# Altium footprint library DBLib.PcbLib: 99 footprints (part 3 of 7)
Each footprint in its own frame and in the unit in brackets; x right, y up, seen from the top. Pads: shape width x height; smd on the part's side, far side on the other; paste and mask are expansions set on the pad; w line width, h text height; cw(c..) or ccw(c..) is an arc to the next point about the centre after c.
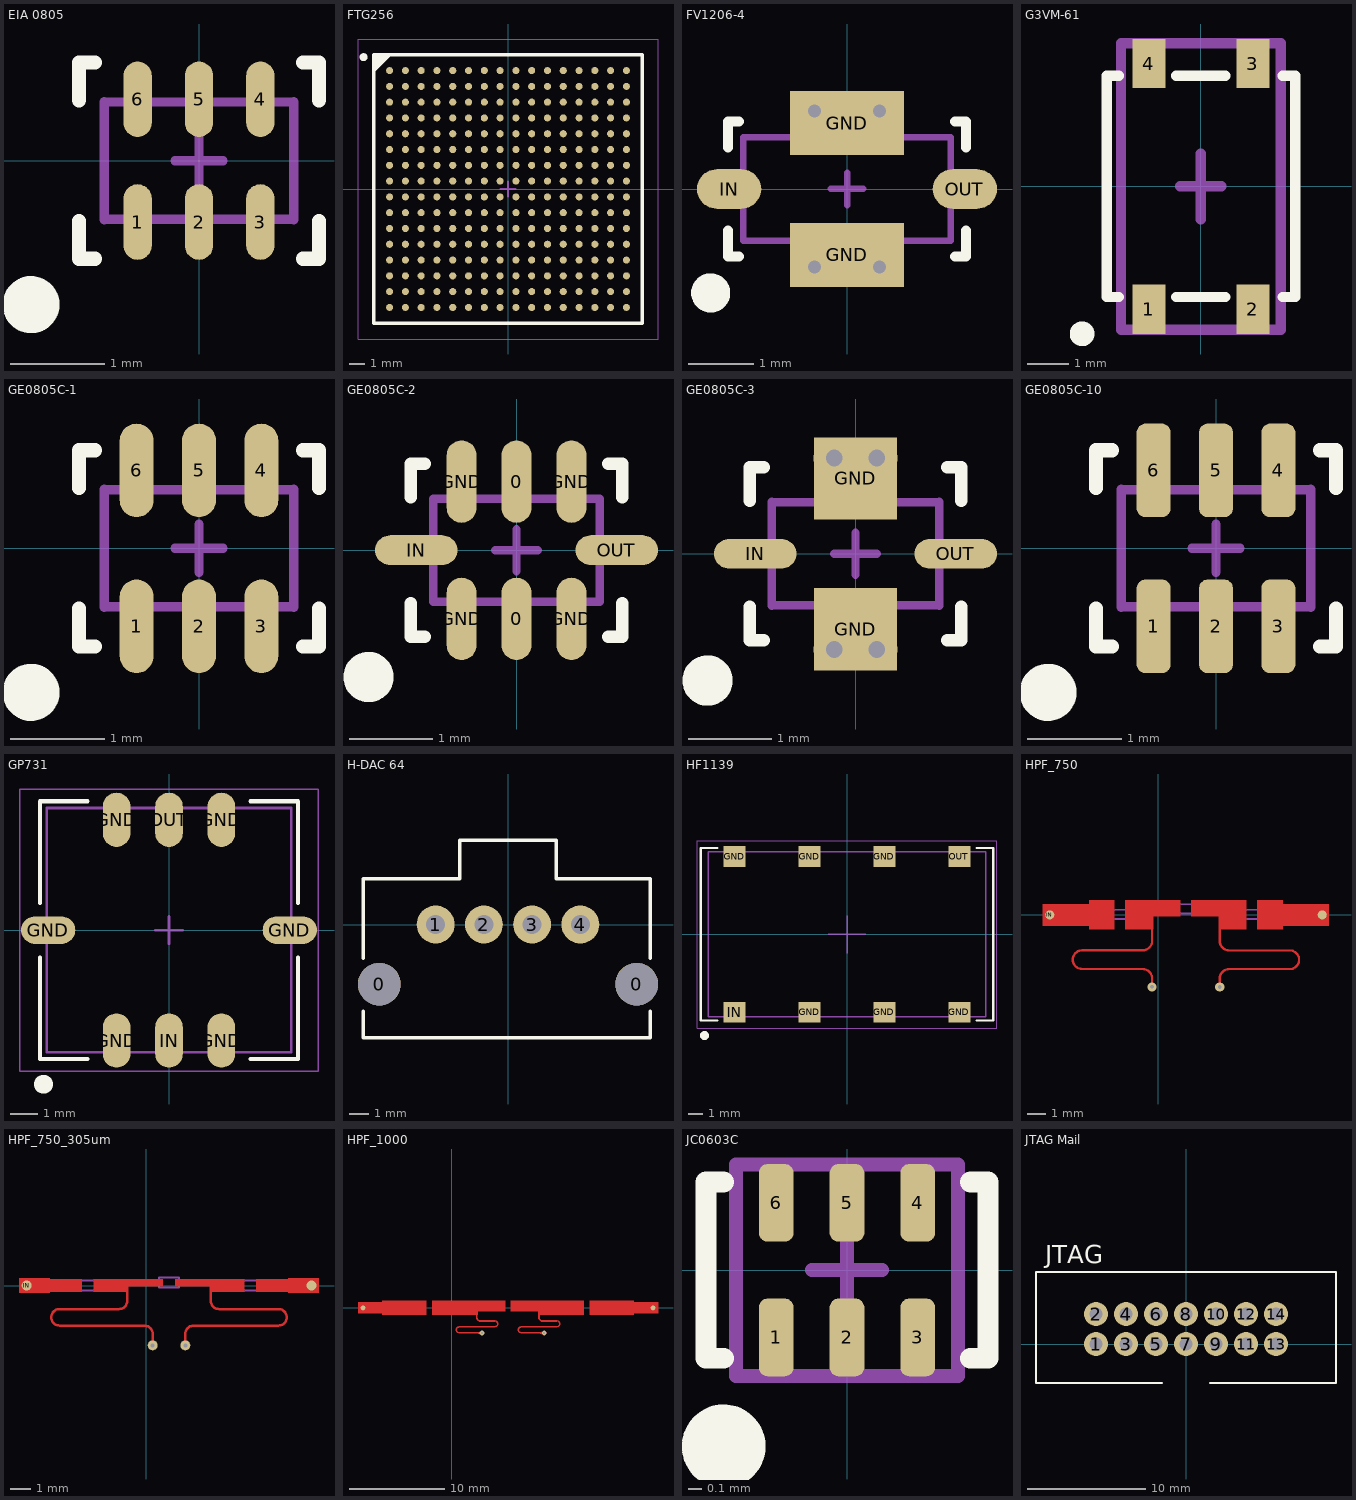
[diagram p2: the footprints below, top view; thin cyan lines are the x and y axes]

## EIA 0805 [mm] "Multilayer Balun"
height 0.95
pads (6):
  oval 0.3x0.8 smd: 1(-0.65,-0.65) 2(0,-0.65) 3(0.65,-0.65) 4(0.65,0.65) 5(0,0.65) 6(-0.65,0.65)
Top Overlay:
  circle w0.35: c-1.778,-1.524 r0.127
  lines w0.15: -1.27,-0.638 -1.27,-1.038 -1.101,-1.038 ; -1.27,0.638 -1.27,1.038 -1.101,1.038 ; 1.101,-1.038 1.27,-1.038 1.27,-0.638 ; 1.101,1.038 1.27,1.038 1.27,0.638
Mechanical 1:
  lines w0.1: -1.005,-0.625 -1.005,0.625 ; -1.005,-0.62 1,-0.62 ; -1.005,0.62 1,0.62 ; -0.254,0 0.254,0 ; 0,-0.254 0,0.254 ; 1.005,-0.625 1.005,0.625
3D body "User Library-Balun2450FB15L0001.step": height 0.8, standoff 0, extent -1,-0.625 1,0.625

## FTG256 [mm] "BGA, 256-Leads, Body 17x17mm, Pitch 1mm"
height 1.55
pads (256):
  round 0.45 smd: A1(-7.5,7.5) A2(-6.5,7.5) A3(-5.5,7.5) A4(-4.5,7.5) A5(-3.5,7.5) A6(-2.5,7.5) A7(-1.5,7.5) A8(-0.5,7.5) A9(0.5,7.5) A10(1.5,7.5) A11(2.5,7.5) A12(3.5,7.5) A13(4.5,7.5) A14(5.5,7.5) A15(6.5,7.5) A16(7.5,7.5) B1(-7.5,6.5) B2(-6.5,6.5) B3(-5.5,6.5) B4(-4.5,6.5) B5(-3.5,6.5) B6(-2.5,6.5) B7(-1.5,6.5) B8(-0.5,6.5) B9(0.5,6.5) B10(1.5,6.5) B11(2.5,6.5) B12(3.5,6.5) B13(4.5,6.5) B14(5.5,6.5) B15(6.5,6.5) B16(7.5,6.5) C1(-7.5,5.5) C2(-6.5,5.5) C3(-5.5,5.5) C4(-4.5,5.5) C5(-3.5,5.5) C6(-2.5,5.5) C7(-1.5,5.5) C8(-0.5,5.5) C9(0.5,5.5) C10(1.5,5.5) C11(2.5,5.5) C12(3.5,5.5) C13(4.5,5.5) C14(5.5,5.5) C15(6.5,5.5) C16(7.5,5.5) D1(-7.5,4.5) D2(-6.5,4.5) D3(-5.5,4.5) D4(-4.5,4.5) D5(-3.5,4.5) D6(-2.5,4.5) D7(-1.5,4.5) D8(-0.5,4.5) D9(0.5,4.5) D10(1.5,4.5) D11(2.5,4.5) D12(3.5,4.5) D13(4.5,4.5) D14(5.5,4.5) D15(6.5,4.5) D16(7.5,4.5) E1(-7.5,3.5) E2(-6.5,3.5) E3(-5.5,3.5) E4(-4.5,3.5) E5(-3.5,3.5) E6(-2.5,3.5) E7(-1.5,3.5) E8(-0.5,3.5) E9(0.5,3.5) E10(1.5,3.5) E11(2.5,3.5) E12(3.5,3.5) E13(4.5,3.5) E14(5.5,3.5) E15(6.5,3.5) E16(7.5,3.5) F1(-7.5,2.5) F2(-6.5,2.5) F3(-5.5,2.5) F4(-4.5,2.5) F5(-3.5,2.5) F6(-2.5,2.5) F7(-1.5,2.5) F8(-0.5,2.5) F9(0.5,2.5) F10(1.5,2.5) F11(2.5,2.5) F12(3.5,2.5) F13(4.5,2.5) F14(5.5,2.5) F15(6.5,2.5) F16(7.5,2.5) G1(-7.5,1.5) G2(-6.5,1.5) G3(-5.5,1.5) G4(-4.5,1.5) G5(-3.5,1.5) G6(-2.5,1.5) G7(-1.5,1.5) G8(-0.5,1.5) G9(0.5,1.5) G10(1.5,1.5) G11(2.5,1.5) G12(3.5,1.5) G13(4.5,1.5) G14(5.5,1.5) G15(6.5,1.5) G16(7.5,1.5) H1(-7.5,0.5) H2(-6.5,0.5) H3(-5.5,0.5) H4(-4.5,0.5) H5(-3.5,0.5) H6(-2.5,0.5) H7(-1.5,0.5) H8(-0.5,0.5) H9(0.5,0.5) H10(1.5,0.5) H11(2.5,0.5) H12(3.5,0.5) H13(4.5,0.5) H14(5.5,0.5) H15(6.5,0.5) H16(7.5,0.5) J1(-7.5,-0.5) J2(-6.5,-0.5) J3(-5.5,-0.5) J4(-4.5,-0.5) J5(-3.5,-0.5) J6(-2.5,-0.5) J7(-1.5,-0.5) J8(-0.5,-0.5) J9(0.5,-0.5) J10(1.5,-0.5) J11(2.5,-0.5) J12(3.5,-0.5) J13(4.5,-0.5) J14(5.5,-0.5) J15(6.5,-0.5) J16(7.5,-0.5) K1(-7.5,-1.5) K2(-6.5,-1.5) K3(-5.5,-1.5) K4(-4.5,-1.5) K5(-3.5,-1.5) K6(-2.5,-1.5) K7(-1.5,-1.5) K8(-0.5,-1.5) K9(0.5,-1.5) K10(1.5,-1.5) K11(2.5,-1.5) K12(3.5,-1.5) K13(4.5,-1.5) K14(5.5,-1.5) K15(6.5,-1.5) K16(7.5,-1.5) L1(-7.5,-2.5) L2(-6.5,-2.5) L3(-5.5,-2.5) L4(-4.5,-2.5) L5(-3.5,-2.5) L6(-2.5,-2.5) L7(-1.5,-2.5) L8(-0.5,-2.5) L9(0.5,-2.5) L10(1.5,-2.5) L11(2.5,-2.5) L12(3.5,-2.5) L13(4.5,-2.5) L14(5.5,-2.5) L15(6.5,-2.5) L16(7.5,-2.5) M1(-7.5,-3.5) M2(-6.5,-3.5) M3(-5.5,-3.5) M4(-4.5,-3.5) M5(-3.5,-3.5) M6(-2.5,-3.5) M7(-1.5,-3.5) M8(-0.5,-3.5) M9(0.5,-3.5) M10(1.5,-3.5) M11(2.5,-3.5) M12(3.5,-3.5) M13(4.5,-3.5) M14(5.5,-3.5) M15(6.5,-3.5) M16(7.5,-3.5) N1(-7.5,-4.5) N2(-6.5,-4.5) N3(-5.5,-4.5) N4(-4.5,-4.5) N5(-3.5,-4.5) N6(-2.5,-4.5) N7(-1.5,-4.5) N8(-0.5,-4.5) N9(0.5,-4.5) N10(1.5,-4.5) N11(2.5,-4.5) N12(3.5,-4.5) N13(4.5,-4.5) N14(5.5,-4.5) N15(6.5,-4.5) N16(7.5,-4.5) P1(-7.5,-5.5) P2(-6.5,-5.5) P3(-5.5,-5.5) P4(-4.5,-5.5) P5(-3.5,-5.5) P6(-2.5,-5.5) P7(-1.5,-5.5) P8(-0.5,-5.5) P9(0.5,-5.5) P10(1.5,-5.5) P11(2.5,-5.5) P12(3.5,-5.5) P13(4.5,-5.5) P14(5.5,-5.5) P15(6.5,-5.5) P16(7.5,-5.5) R1(-7.5,-6.5) R2(-6.5,-6.5) R3(-5.5,-6.5) R4(-4.5,-6.5) R5(-3.5,-6.5) R6(-2.5,-6.5) R7(-1.5,-6.5) R8(-0.5,-6.5) R9(0.5,-6.5) R10(1.5,-6.5) R11(2.5,-6.5) R12(3.5,-6.5) R13(4.5,-6.5) R14(5.5,-6.5) R15(6.5,-6.5) R16(7.5,-6.5) T1(-7.5,-7.5) T2(-6.5,-7.5) T3(-5.5,-7.5) T4(-4.5,-7.5) T5(-3.5,-7.5) T6(-2.5,-7.5) T7(-1.5,-7.5) T8(-0.5,-7.5) T9(0.5,-7.5) T10(1.5,-7.5) T11(2.5,-7.5) T12(3.5,-7.5) T13(4.5,-7.5) T14(5.5,-7.5) T15(6.5,-7.5) T16(7.5,-7.5)
Top Overlay:
  circle w0.25: c-9.15,8.35 r0.125
  region: -7.5,8.5 -8.5,7.5 -8.5,8.5
  lines w0.2: -8.5,7.5 -7.5,8.5 ; -8.5,-8.5 -8.5,8.5 8.5,8.5 8.5,-8.5 -8.5,-8.5
Mechanical 1:
  lines w0.05: -9.5,-9.5 -9.5,9.5 9.5,9.5 9.5,-9.5 -9.5,-9.5
  lines w0.1: -0.5,0 0.5,0 ; 0,-0.5 0,0.5 ; -8.5,-8.5 8.5,-8.5 8.5,8.5 -8.5,8.5 -8.5,-8.5
3D body "User Library-BGA 256 17x17mm 1mm pitch.step": height 1.7, standoff -0.05, extent -8.5,-8.5 8.5,8.5

## FV1206-4 [mm] "Bandpass Filter"
height 0.94
pads (4):
  rect 1.75x0.99 smd: GND(0,-1.015) GND(0,1.015)
  oval 0.99x0.61 smd: IN(-1.815,0) OUT(1.815,0)
via 0.5,-1.2 diameter 0.5 hole 0.2
via -0.5,-1.2 diameter 0.5 hole 0.2
via 0.5,1.2 diameter 0.5 hole 0.2
via -0.5,1.2 diameter 0.5 hole 0.2
Top Overlay:
  circle w0.35: c-2.1,-1.6 r0.127
  lines w0.15: -1.832,-0.638 -1.832,-1.038 -1.663,-1.038 ; -1.832,0.638 -1.832,1.038 -1.663,1.038 ; 1.663,-1.038 1.832,-1.038 1.832,-0.638 ; 1.663,1.038 1.832,1.038 1.832,0.638
Mechanical 1:
  lines w0.1: -0.254,0 0.254,0 ; 0,-0.254 0,0.254 ; -1.6,-0.8 1.6,-0.8 1.6,0.8 -1.6,0.8 -1.6,-0.8
3D body "User Library-LFCN-2250.STEP": height 0.94, standoff 0, extent -1.6,-0.8 1.6,0.8

## G3VM-61 [mm] "MOS FET Relays"
height 2.1
pads (4):
  rect 0.8x1.2 smd: 1(-1.27,-3) 2(1.27,-3) 3(1.27,3) 4(-1.27,3)
Top Overlay:
  circle w0.35: c-2.9,-3.6 r0.127
  lines w0.254: -2,-2.7 -2.3,-2.7 -2.3,2.7 -2,2.7 ; -0.6,-2.7 0.6,-2.7 ; -0.6,2.7 0.6,2.7 ; 2,-2.7 2.3,-2.7 2.3,2.7 2,2.7
Mechanical 1:
  lines w0.254: -0.5,0 0.5,0 ; 0,-0.8 0,0.8 ; -1.95,-3.5 -1.95,3.5 1.95,3.5 1.95,-3.5 -1.95,-3.5
3D body "g3vm-61g1.stp": height 2.05, standoff -0.05, extent -1.95,-3.5 1.95,3.5

## GE0805C-1 [mm] "RF Transformer"
height 0.94
pads (6):
  oval 0.36x0.99 smd: 1(-0.66,-0.825) 2(0,-0.825) 3(0.66,-0.825) 4(0.66,0.825) 5(0,0.825) 6(-0.66,0.825)
Top Overlay:
  circle w0.35: c-1.778,-1.524 r0.127
  lines w0.15: -1.27,-0.638 -1.27,-1.038 -1.101,-1.038 ; -1.27,0.638 -1.27,1.038 -1.101,1.038 ; 1.101,-1.038 1.27,-1.038 1.27,-0.638 ; 1.101,1.038 1.27,1.038 1.27,0.638
Mechanical 1:
  lines w0.1: -1.005,-0.625 -1.005,0.625 ; -1.005,-0.62 1,-0.62 ; -1.005,0.62 1,0.62 ; -0.254,0 0.254,0 ; 0,-0.254 0,0.254 ; 1.005,-0.625 1.005,0.625
3D body "User Library-Balun2450FB15L0001.step": height 0.8, standoff 0, extent -1,-0.625 1,0.625

## GE0805C-2 [mm] "Low Pass Filter"
height 0.94
pads (8):
  oval 0.36x0.99 smd: 0(0,-0.825) 0(0,0.825) GND(-0.66,-0.825) GND(-0.66,0.825) GND(0.66,-0.825) GND(0.66,0.825)
  oval 0.99x0.36 smd: IN(-1.205,0) OUT(1.205,0)
Top Overlay:
  circle w0.35: c-1.778,-1.524 r0.127
  lines w0.15: -1.27,-0.638 -1.27,-1.038 -1.101,-1.038 ; -1.27,0.638 -1.27,1.038 -1.101,1.038 ; 1.101,-1.038 1.27,-1.038 1.27,-0.638 ; 1.101,1.038 1.27,1.038 1.27,0.638
Mechanical 1:
  lines w0.1: -0.254,0 0.254,0 ; 0,-0.254 0,0.254 ; -1,-0.62 1,-0.62 1,0.62 -1,0.62 -1,-0.62
3D body "User Library-Balun2450FB15L0001.step": height 0.8, standoff 0, extent -1,-0.625 1,0.625

## GE0805C-3 [mm] "Bandpass Filter"
height 0.94
pads (4):
  rect 1x0.99 smd: GND(0,-0.905) GND(0,0.905)
  oval 0.99x0.36 smd: IN(-1.205,0) OUT(1.205,0)
via -0.254,1.15 diameter 0.5 hole 0.2
via 0.254,1.15 diameter 0.5 hole 0.2
via -0.254,-1.15 diameter 0.5 hole 0.2
via 0.254,-1.15 diameter 0.5 hole 0.2
Top Overlay:
  circle w0.35: c-1.778,-1.524 r0.127
  lines w0.15: -1.27,-0.638 -1.27,-1.038 -1.101,-1.038 ; -1.27,0.638 -1.27,1.038 -1.101,1.038 ; 1.101,-1.038 1.27,-1.038 1.27,-0.638 ; 1.101,1.038 1.27,1.038 1.27,0.638
Mechanical 1:
  lines w0.1: -1.005,-0.625 -1.005,0.625 ; -1.005,-0.62 1,-0.62 ; -1.005,0.62 1,0.62 ; -0.254,0 0.254,0 ; 0,-0.254 0,0.254 ; 1.005,-0.625 1.005,0.625
3D body "User Library-3600BP15M600.step": height 0.93, standoff -0.03, extent -1.001,-0.626 1.001,0.626

## GE0805C-10 [mm] "Diplexer"
height 0.94
pads (6):
  rrect50% 0.36x0.99 smd: 1(-0.66,-0.825) 2(0,-0.825) 3(0.66,-0.825) 4(0.66,0.825) 5(0,0.825) 6(-0.66,0.825)
Top Overlay:
  circle w0.35: c-1.778,-1.524 r0.127
  lines w0.15: -1.27,-0.638 -1.27,-1.038 -1.101,-1.038 ; -1.27,0.638 -1.27,1.038 -1.101,1.038 ; 1.101,-1.038 1.27,-1.038 1.27,-0.638 ; 1.101,1.038 1.27,1.038 1.27,0.638
Mechanical 1:
  lines w0.1: -1.005,-0.625 -1.005,0.625 ; -1.005,-0.62 1,-0.62 ; -1.005,0.62 1,0.62 ; -0.254,0 0.254,0 ; 0,-0.254 0,0.254 ; 1.005,-0.625 1.005,0.625
3D body "User Library-Balun2450FB15L0001.step": height 0.8, standoff 0, extent -1,-0.625 1,0.625

## GP731 [mm] "Low Pass Filter"
height 2.54
pads (8):
  oval 2x1.02 smd: GND(-4.451,0) GND(4.451,0)
  oval 1.02x2 smd: GND(-1.93,-4.065) GND(-1.93,4.065) GND(1.93,-4.065) GND(1.93,4.065) IN(0,-4.065) OUT(0,4.065)
Top Overlay:
  circle w0.35: c-4.625,-5.675 r0.175
  lines w0.15: -4.75,-1 -4.75,-4.75 -3,-4.75 ; -4.75,1 -4.75,4.75 -3,4.75 ; 3,-4.75 4.75,-4.75 4.75,-1 ; 3,4.75 4.75,4.75 4.75,1
Mechanical 1:
  lines w0.05: -5.5,-5.2 -5.5,5.2 5.5,5.2 5.5,-5.2 -5.5,-5.2
  lines w0.1: -0.5,0 0.5,0 ; 0,-0.5 0,0.5 ; -4.5,-4.5 -4.5,4.5 4.5,4.5 4.5,-4.5 -4.5,-4.5
3D body "User Library-RBP-275+.step": height 2.54, standoff 0, extent -4.455,-4.455 4.455,4.465

## H-DAC 64 [mm]
height 25
pads (6):
  round 2.25 hole 2.25 unplated: 0(-6.78,-3.14) 0(6.78,-3.14)
  round 2 hole 1: 1(-3.81,0) 2(-1.27,0) 3(1.27,0) 4(3.81,0)
Top Overlay:
  lines w0.178: -7.62,-4.572 -7.62,-5.969 7.493,-5.969 7.493,-4.572 ; -7.62,-1.778 -7.62,0.032 -7.62,2.413 -2.54,2.413 -2.54,4.445 2.54,4.445 2.54,2.413 7.493,2.413 7.493,-1.778
3D body "311010040.stp": height 22.07, standoff -5.07, extent -8.098,-5.721 8.098,7.239

## HF1139 [mm] "Low Pass Filter"
height 6.86
pads (8):
  rect 1.52x1.4 smd: GND(-7.62,5.27) GND(-2.54,-5.27) GND(-2.54,5.27) GND(2.54,-5.27) GND(2.54,5.27) GND(7.62,-5.27) IN(-7.62,-5.27) OUT(7.62,5.27)
Top Overlay:
  circle w0.35: c-9.652,-6.858 r0.127
  lines w0.15: -8.763,-5.842 -9.908,-5.842 -9.908,5.842 -8.763,5.842 ; 8.763,-5.842 9.906,-5.842 ; 8.763,5.842 9.906,5.842 ; 9.908,-5.842 9.908,5.842
Mechanical 1:
  lines w0.05: -10.16,-6.35 -10.16,6.35 10.16,6.35 10.16,-6.35 -10.16,-6.35
  lines w0.1: -1.27,0 1.27,0 ; 0,-1.27 0,1.27 ; -9.398,-5.588 -9.398,5.588 9.398,5.588 9.398,-5.588 -9.398,-5.588
3D body: height 1, standoff 0, extent -9.398,-5.588 9.398,5.588
3D body: height 6.86, standoff 1, extent -8.89,-5.08 8.89,5.08

## HPF_750 [mm] "stripline HPF"
pads (2):
  round 0.5 smd: IN(-5.969,0) OUT(9.017,0)
via -0.342,-3.959 diameter 0.5 hole 0.2
via 3.381,-3.964 diameter 0.5 hole 0.2
Top Layer:
  region: 3.318,-0.797 3.318,0.797 4.846,0.797 4.846,-0.797
  region: 1.818,-0.067 3.318,-0.067 3.318,0.797 1.818,0.797
  region: -6.35,-0.59 -3.81,-0.59 -3.81,0.59 -6.35,0.59
  region: -3.81,-0.797 -3.81,0.797 -2.409,0.797 -2.409,-0.797
  region: -1.809,-0.797 -1.809,0.797 -0.282,0.797 -0.282,-0.797
  region: -0.282,-0.067 -0.282,0.797 1.218,0.797 1.218,-0.067
  region: 5.446,-0.797 5.446,0.797 6.846,0.797 6.846,-0.797
  region: 6.846,-0.59 9.386,-0.59 9.386,0.59 6.846,0.59
  lines w0.127: -0.342,-3.959 -0.342,-3.489 ccw(c-0.856,-3.489) -0.856,-2.975 -4.19,-2.975 cw(c-4.19,-2.462) -4.704,-2.462 cw(c-4.19,-2.462) -4.19,-1.948 -0.856,-1.948 ccw(c-0.856,-1.435) -0.342,-1.435 -0.342,-0.8 ; 3.381,-3.964 3.381,-3.494 cw(c3.894,-3.494) 3.894,-2.98 7.229,-2.98 ccw(c7.229,-2.467) 7.742,-2.467 ccw(c7.229,-2.467) 7.229,-1.953 3.894,-1.953 cw(c3.894,-1.44) 3.381,-1.44 3.381,-0.805
Top Solder:
  region: -6.526,2.174 9.574,2.174 9.614,2.174 9.687,2.144 9.744,2.087 9.774,2.014 9.774,1.974 9.774,-4.626 9.774,-4.666 9.743,-4.739 9.687,-4.796 9.614,-4.826 9.574,-4.826 -6.526,-4.826 -6.566,-4.826 -6.639,-4.796 -6.696,-4.739 -6.726,-4.666 -6.726,-4.626 -6.726,1.974 -6.726,2.014 -6.696,2.087 -6.639,2.143 -6.566,2.174
Mechanical 1:
  lines w0.1: -2.582,-0.217 -2.582,0.283 -1.582,0.283 -1.582,-0.217 -2.582,-0.217 ; 1.018,0.083 1.018,0.583 2.018,0.583 2.018,0.083 1.018,0.083 ; 4.618,-0.217 4.618,0.283 5.618,0.283 5.618,-0.217 4.618,-0.217
3D body "0402-SMD CAPACITOR.step": height 0.49, standoff -0.01, extent 4.618,-0.217 5.618,0.283
3D body "0402-SMD CAPACITOR.step": height 0.49, standoff -0.01, extent 1.018,0.083 2.018,0.583
3D body "0402-SMD CAPACITOR.step": height 0.49, standoff -0.01, extent -2.582,-0.217 -1.582,0.283

## HPF_750_305um [mm] "stripline HPF"
pads (4):
  round 0.5 hole 0.2: GND(0.326,-2.986) GND(1.957,-2.986)
  round 0.5 smd: IN(-5.969,0) OUT(8.255,0)
Top Layer:
  region: 7.109,-0.355 8.634,-0.355 8.634,0.355 7.109,0.355
  region: 5.499,-0.315 7.109,-0.315 7.109,0.315 5.499,0.315
  region: 3.164,-0.315 3.164,0.315 4.899,0.315 4.899,-0.315
  region: 1.441,-0.041 3.164,-0.041 3.164,0.315 1.441,0.315
  region: -0.882,-0.041 0.841,-0.041 0.841,0.315 -0.882,0.315
  region: -2.616,-0.315 -2.616,0.315 -0.882,0.315 -0.882,-0.315
  region: -4.826,-0.315 -3.216,-0.315 -3.216,0.315 -4.826,0.315
  region: -6.351,-0.355 -6.351,0.355 -4.826,0.355 -4.826,-0.355
  lines w0.125: -4.32,-1.174 ccw(c-4.32,-1.587) -4.733,-1.587 ; -4.318,-1.174 -1.357,-1.174 ccw(c-1.357,-0.762) -0.944,-0.762 -0.944,-0.315 ; 0.326,-2.986 0.326,-2.667 0.326,-2.412 ccw(c-0.087,-2.412) -0.087,-1.999 -4.32,-1.999 cw(c-4.32,-1.587) -4.733,-1.587 ; 1.957,-2.986 1.957,-2.667 1.957,-2.412 cw(c2.369,-2.412) 2.369,-1.999 6.603,-1.999 ccw(c6.603,-1.587) 7.016,-1.587 ; 3.227,-0.315 3.227,-0.762 ccw(c3.639,-0.762) 3.639,-1.174 6.601,-1.174 ; 6.603,-1.174 cw(c6.603,-1.587) 7.016,-1.587 ; -4.733,-1.587 -4.733,-1.587 ; 7.016,-1.587 7.016,-1.587
Mechanical 1:
  lines w0.1: -3.42,-0.243 -3.42,0.257 -2.42,0.257 -2.42,-0.243 -3.42,-0.243 ; 0.638,-0.105 0.638,0.395 1.638,0.395 1.638,-0.105 0.638,-0.105 ; 4.693,-0.242 4.693,0.258 5.693,0.258 5.693,-0.242 4.693,-0.242
3D body "0402-SMD CAPACITOR.step": height 0.49, standoff -0.01, extent 4.693,-0.242 5.693,0.258
3D body "0402-SMD CAPACITOR.step": height 0.49, standoff -0.01, extent 0.638,-0.105 1.638,0.395
3D body "0402-SMD CAPACITOR.step": height 0.49, standoff -0.01, extent -3.42,-0.243 -2.42,0.257

## HPF_1000 [mm] "stripline HPF"
pads (2):
  round 0.5 smd: IN(-9.271,0) OUT(21.082,0)
via 3.191,-2.619 diameter 0.5 hole 0.2
via 9.689,-2.619 diameter 0.5 hole 0.2
Top Layer:
  region: -9.797,-0.575 -7.257,-0.575 -7.257,0.606 -9.797,0.606
  region: -7.257,-0.73 -7.257,0.761 -2.633,0.761 -2.633,-0.73
  region: -2.033,-0.73 2.718,-0.73 2.718,0.761 -2.033,0.761
  region: 2.718,-0.352 2.718,0.761 5.603,0.761 5.603,-0.352
  region: 6.203,-0.352 9.089,-0.352 9.089,0.761 6.203,0.761
  region: 9.089,-0.73 13.84,-0.73 13.84,0.761 9.089,0.761
  region: 19.063,-0.575 21.603,-0.575 21.603,0.606 19.063,0.606
  region: 14.44,-0.73 19.063,-0.73 19.063,0.761 14.44,0.761
  region: 313 vertices and 0 holes, not listed, extent 0.434,-2.675 4.873,-0.612
  region: 313 vertices and 0 holes, not listed, extent 6.933,-2.675 11.372,-0.612
  region: 9.297,-2.555 9.318,-2.554 9.339,-2.551 9.36,-2.545 9.381,-2.538 9.403,-2.528 9.424,-2.515 9.445,-2.501 9.467,-2.484 9.489,-2.465 9.511,-2.444 9.511,-2.794 9.489,-2.773 9.467,-2.754 9.445,-2.737 9.424,-2.723 9.403,-2.71 9.381,-2.7 9.36,-2.692 9.339,-2.687 9.318,-2.684 9.297,-2.682
  region: 2.799,-2.555 2.82,-2.554 2.841,-2.551 2.862,-2.545 2.883,-2.538 2.904,-2.528 2.926,-2.515 2.947,-2.501 2.969,-2.484 2.991,-2.465 3.012,-2.444 3.012,-2.794 2.991,-2.773 2.969,-2.754 2.947,-2.737 2.926,-2.723 2.904,-2.71 2.883,-2.7 2.862,-2.692 2.841,-2.687 2.82,-2.684 2.799,-2.682
Top Solder:
  region: -9.271,2.54 21.082,2.54 21.132,2.54 21.226,2.502 21.297,2.43 21.336,2.337 21.336,2.286 21.336,-3.556 21.336,-3.607 21.297,-3.7 21.226,-3.771 21.133,-3.81 21.082,-3.81 -9.271,-3.81 -9.322,-3.81 -9.415,-3.771 -9.486,-3.7 -9.525,-3.607 -9.525,-3.556 -9.525,2.286 -9.525,2.337 -9.486,2.43 -9.415,2.501 -9.322,2.54

## JC0603C [mm] "Diplexer"
height 0.61
pads (6):
  rrect50% 0.25x0.56 smd: 1(-0.51,-0.485) 2(0,-0.485) 3(0.51,-0.485) 4(0.51,0.485) 5(0,0.485) 6(-0.51,0.485)
Top Overlay:
  circle w0.35: c-0.889,-1.27 r0.127
  lines w0.15: -0.889,-0.635 -1.016,-0.635 -1.016,0.635 -0.889,0.635 ; 0.889,-0.635 1.016,-0.635 1.016,0.635 0.889,0.635
Mechanical 1:
  lines w0.1: -0.254,0 0.254,0 ; 0,-0.254 0,0.254 ; -0.8,-0.762 -0.8,0.762 0.8,0.762 0.8,-0.762 -0.8,-0.762
3D body "User Library-DCW-30-272+ (JC0603C).step": height 0.62, standoff -0.01, extent -0.8,-0.405 0.8,0.405

## JTAG Mail [mil]
height 114.17
pads (14):
  round 80 hole 42: 1(-300,0) 2(-300,100) 3(-200,0) 4(-200,100) 5(-100,0) 6(-100,100) 7(0,0) 8(0,100) 9(100,0) 10(100,100) 11(200,0) 12(200,100) 13(300,0) 14(300,100)
Top Overlay:
  lines w7.87: -80,-130 -500,-130 -500,240 500,240 500,-130 80,-130
  text "JTAG" at -470,270 h60
3D body "User Library-IDC Socket Male 14pin Straight THT Goldplated 2_54mm.step": height 363.39, standoff -124.8, extent -499.6,-117.32 499.61,231.11